# Altium footprint library Power_PcbLib.PcbLib: 23 footprints (part 2 of 2)
Each footprint in its own frame and in the unit in brackets; x right, y up, seen from the top. Pads: shape width x height; smd on the part's side, far side on the other; paste and mask are expansions set on the pad; w line width, h text height; cw(c..) or ccw(c..) is an arc to the next point about the centre after c.
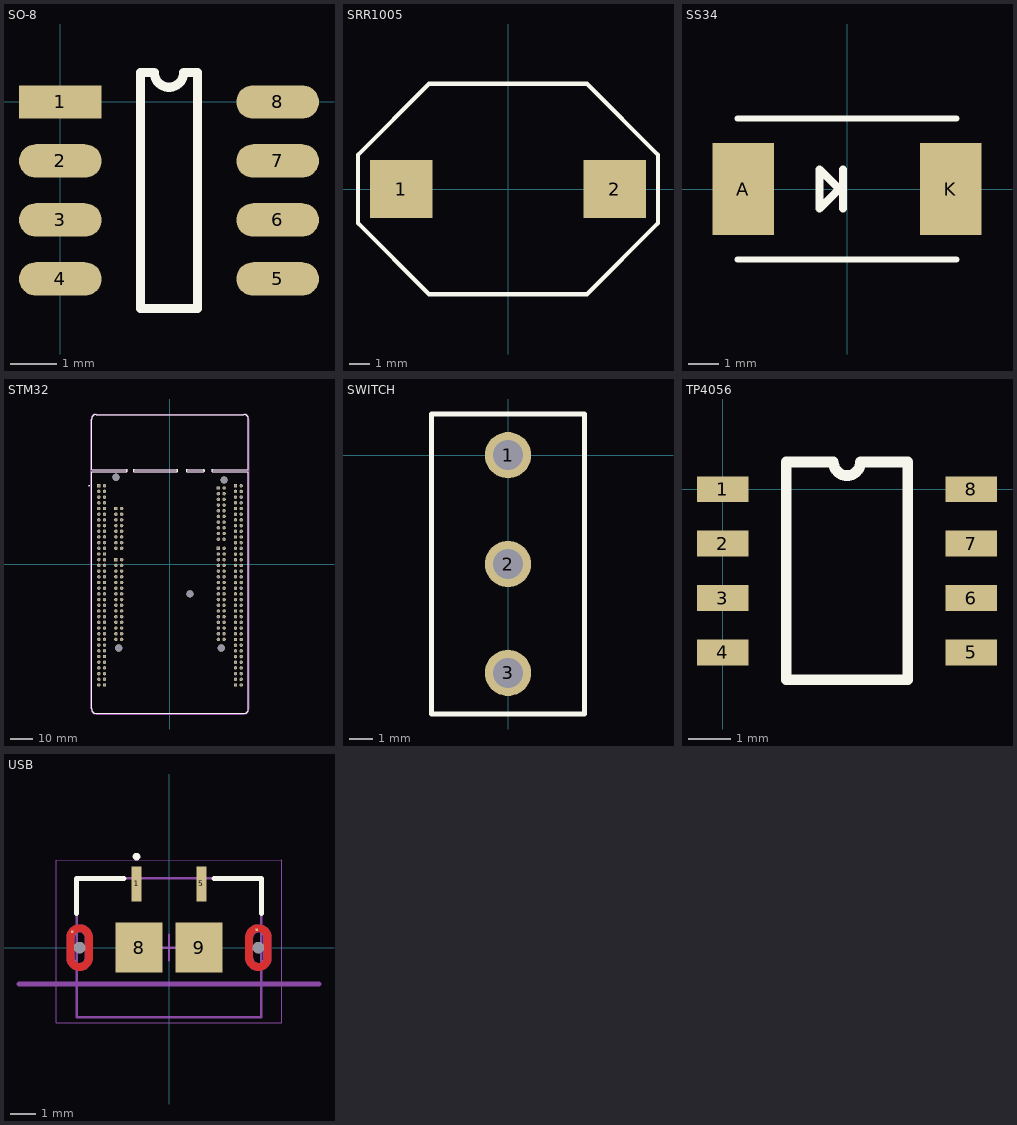
[diagram p1: the footprints below, top view; thin cyan lines are the x and y axes]

## SO-8 [mm]
pads (8):
  rect 1.78x0.72 smd: 1(0,0)
  oval 1.78x0.72 smd: 2(0,-1.27) 3(0,-2.54) 4(0,-3.81) 5(4.68,-3.81) 6(4.68,-2.54) 7(4.68,-1.27) 8(4.68,0)
Top Overlay:
  lines w0.2: 1.725,-4.445 1.725,0.635 2.023,0.635 ccw(c2.34,0.635) 2.658,0.635 2.955,0.635 2.955,-4.445 1.725,-4.445

## SRR1005 [mm]
pads (2):
  rect 3x2.8 smd: 1(-5.15,0) 2(5.15,0)
Top Overlay:
  lines w0.2: -7.239,-1.651 -7.239,1.651 -3.81,5.08 3.81,5.08 7.239,1.651 7.239,-1.651 3.81,-5.08 -3.81,-5.08 -7.239,-1.651

## SS34 [mm]
pads (2):
  rect 2x3 smd: A(-3.375,0) K(3.375,0)
Top Overlay:
  lines w0.2: -3.556,-2.286 3.556,-2.286 ; -3.556,2.286 3.556,2.286
  lines w0.254: -0.127,-0.635 -0.127,0.635 ; -0.889,-0.635 -0.889,0.635 -0.254,0 -0.889,-0.635

## STM32 [mm]
pads (249):
  rect 1.53x1.53 hole 1.02: CN7_1(21.717,33.914) CN8_1(-24.003,24.77) CN9_1(-24.003,1.91) CN10_1(21.717,6.99) CN11_1(-31.623,34.93) CN12_1(29.337,34.91)
  round 1.53 hole 1.02: CN7_2(24.257,33.914) CN7_3(21.717,31.374) CN7_4(24.257,31.374) CN7_5(21.717,28.834) CN7_6(24.257,28.834) CN7_7(21.717,26.294) CN7_8(24.257,26.294) CN7_9(21.717,23.754) CN7_10(24.257,23.754) CN7_11(21.717,21.214) CN7_12(24.257,21.214) CN7_13(21.717,18.674) CN7_14(24.257,18.674) CN7_15(21.717,16.134) CN7_16(24.257,16.134) CN7_17(21.717,13.594) CN7_18(24.257,13.594) CN7_19(21.717,11.054) CN7_20(24.257,11.054) CN8_2(-21.463,24.77) CN8_3(-24.003,22.23) CN8_4(-21.463,22.23) CN8_5(-24.003,19.69) CN8_6(-21.463,19.69) CN8_7(-24.003,17.15) CN8_8(-21.463,17.15) CN8_9(-24.003,14.61) CN8_10(-21.463,14.61) CN8_11(-24.003,12.07) CN8_12(-21.463,12.07) CN8_13(-24.003,9.53) CN8_14(-21.463,9.53) CN8_15(-24.003,6.99) CN8_16(-21.463,6.99) CN9_2(-21.463,1.91) CN9_3(-24.003,-0.63) CN9_4(-21.463,-0.63) CN9_5(-24.003,-3.17) CN9_6(-21.463,-3.17) CN9_7(-24.003,-5.71) CN9_8(-21.463,-5.71) CN9_9(-24.003,-8.25) CN9_10(-21.463,-8.25) CN9_11(-24.003,-10.79) CN9_12(-21.463,-10.79) CN9_13(-24.003,-13.33) CN9_14(-21.463,-13.33) CN9_15(-24.003,-15.87) CN9_16(-21.463,-15.87) CN9_17(-24.003,-18.41) CN9_18(-21.463,-18.41) CN9_19(-24.003,-20.95) CN9_20(-21.463,-20.95) CN9_21(-24.003,-23.49) CN9_22(-21.463,-23.49) CN9_23(-24.003,-26.03) CN9_24(-21.463,-26.03) CN9_25(-24.003,-28.57) CN9_26(-21.463,-28.57) CN9_27(-24.003,-31.11) CN9_28(-21.463,-31.11) CN9_29(-24.003,-33.65) CN9_30(-21.463,-33.65) CN10_2(24.257,6.99) CN10_3(21.717,4.45) CN10_4(24.257,4.45) CN10_5(21.717,1.91) CN10_6(24.257,1.91) CN10_7(21.717,-0.63) CN10_8(24.257,-0.63) CN10_9(21.717,-3.17) CN10_10(24.257,-3.17) CN10_11(21.717,-5.71) CN10_12(24.257,-5.71) CN10_13(21.717,-8.25) CN10_14(24.257,-8.25) CN10_15(21.717,-10.79) CN10_16(24.257,-10.79) CN10_17(21.717,-13.33) CN10_18(24.257,-13.33) CN10_19(21.717,-15.87) CN10_20(24.257,-15.87) CN10_21(21.717,-18.41) CN10_22(24.257,-18.41) CN10_23(21.717,-20.95) CN10_24(24.257,-20.95) CN10_25(21.717,-23.49) CN10_26(24.257,-23.49) CN10_27(21.717,-26.03) CN10_28(24.257,-26.03) CN10_29(21.717,-28.57) CN10_30(24.257,-28.57) CN10_31(21.717,-31.11) CN10_32(24.257,-31.11) CN10_33(21.717,-33.65) CN10_34(24.257,-33.65) CN11_2(-29.083,34.93) CN11_3(-31.623,32.39) CN11_4(-29.083,32.39) CN11_5(-31.623,29.85) CN11_6(-29.083,29.85) CN11_7(-31.623,27.31) CN11_8(-29.083,27.31) CN11_9(-31.623,24.77) CN11_10(-29.083,24.77) CN11_11(-31.623,22.23) CN11_12(-29.083,22.23) CN11_13(-31.623,19.69) CN11_14(-29.083,19.69) CN11_15(-31.623,17.15) CN11_16(-29.083,17.15) CN11_17(-31.623,14.61) CN11_18(-29.083,14.61) CN11_19(-31.623,12.07) CN11_20(-29.083,12.07) CN11_21(-31.623,9.53) CN11_22(-29.083,9.53) CN11_23(-31.623,6.99) CN11_24(-29.083,6.99) CN11_25(-31.623,4.45) CN11_26(-29.083,4.45) CN11_27(-31.623,1.91) CN11_28(-29.083,1.91) CN11_29(-31.623,-0.63) CN11_30(-29.083,-0.63) CN11_31(-31.623,-3.17) CN11_32(-29.083,-3.17) CN11_33(-31.623,-5.71) CN11_34(-29.083,-5.71) CN11_35(-31.623,-8.25) CN11_36(-29.083,-8.25) CN11_37(-31.623,-10.79) CN11_38(-29.083,-10.79) CN11_39(-31.623,-13.33) CN11_40(-29.083,-13.33) CN11_41(-31.623,-15.87) CN11_42(-29.083,-15.87) CN11_43(-31.623,-18.41) CN11_44(-29.083,-18.41) CN11_45(-31.623,-20.95) CN11_46(-29.083,-20.95) CN11_47(-31.623,-23.49) CN11_48(-29.083,-23.49) CN11_49(-31.623,-26.03) CN11_50(-29.083,-26.03) CN11_51(-31.623,-28.57) CN11_52(-29.083,-28.57) CN11_53(-31.623,-31.11) CN11_54(-29.083,-31.11) CN11_55(-31.623,-33.65) CN11_56(-29.083,-33.65) CN11_57(-31.623,-36.19) CN11_58(-29.083,-36.19) CN11_59(-31.623,-38.73) CN11_60(-29.083,-38.73) CN11_61(-31.623,-41.27) CN11_62(-29.083,-41.27) CN11_63(-31.623,-43.81) CN11_64(-29.083,-43.81) CN11_65(-31.623,-46.35) CN11_66(-29.083,-46.35) CN11_67(-31.623,-48.89) CN11_68(-29.083,-48.89) CN11_69(-31.623,-51.43) CN11_70(-29.083,-51.43) CN11_71(-31.623,-53.97) CN11_72(-29.083,-53.97) CN12_2(31.877,34.91) CN12_3(29.337,32.37) CN12_4(31.877,32.37) CN12_5(29.337,29.83) CN12_6(31.877,29.83) CN12_7(29.337,27.29) CN12_8(31.877,27.29) CN12_9(29.337,24.75) CN12_10(31.877,24.75) CN12_11(29.337,22.21) CN12_12(31.877,22.21) CN12_13(29.337,19.67) CN12_14(31.877,19.67) CN12_15(29.337,17.13) CN12_16(31.877,17.13) CN12_17(29.337,14.59) CN12_18(31.877,14.59) CN12_19(29.337,12.05) CN12_20(31.877,12.05) CN12_21(29.337,9.51) CN12_22(31.877,9.51) CN12_23(29.337,6.97) CN12_24(31.877,6.97) CN12_25(29.337,4.43) CN12_26(31.877,4.43) CN12_27(29.337,1.89) CN12_28(31.877,1.89) CN12_29(29.337,-0.65) CN12_30(31.877,-0.65) CN12_31(29.337,-3.19) CN12_32(31.877,-3.19) CN12_33(29.337,-5.73) CN12_34(31.877,-5.73) CN12_35(29.337,-8.27) CN12_36(31.877,-8.27) CN12_37(29.337,-10.81) CN12_38(31.877,-10.81) CN12_39(29.337,-13.35) CN12_40(31.877,-13.35) CN12_41(29.337,-15.89) CN12_42(31.877,-15.89) CN12_43(29.337,-18.43) CN12_44(31.877,-18.43) CN12_45(29.337,-20.97) CN12_46(31.877,-20.97) CN12_47(29.337,-23.51) CN12_48(31.877,-23.51) CN12_49(29.337,-26.05) CN12_50(31.877,-26.05) CN12_51(29.337,-28.59) CN12_52(31.877,-28.59) CN12_53(29.337,-31.13) CN12_54(31.877,-31.13) CN12_55(29.337,-33.67) CN12_56(31.877,-33.67) CN12_57(29.337,-36.21) CN12_58(31.877,-36.21) CN12_59(29.337,-38.75) CN12_60(31.877,-38.75) CN12_61(29.337,-41.29) CN12_62(31.877,-41.29) CN12_63(29.337,-43.83) CN12_64(31.877,-43.83) CN12_65(29.337,-46.37) CN12_66(31.877,-46.37) CN12_67(29.337,-48.91) CN12_68(31.877,-48.91) CN12_69(29.337,-51.45) CN12_70(31.877,-51.45) CN12_71(29.337,-53.99) CN12_72(31.877,-53.99)
  round 3.2 hole 3.2 unplated: ""(-24.003,38.74) ""(-22.733,-37.46) ""(9.017,-13.33) ""(22.987,-37.46) ""(24.257,37.47)
Top Overlay:
  circle w0.2: c-35.913,34.93 r0.1
  lines w0.127: -19.38,41.17 -34.873,41.17 -34.873,-64.67 ccw(c-32.873,-64.67) -32.873,-66.67 33.127,-66.67 ccw(c33.127,-64.67) 35.127,-64.67 35.127,41.17 19.126,41.17 ; -19.38,42.11 -34.873,42.11 -34.873,64.67 cw(c-32.873,64.67) -32.873,66.67 33.127,66.67 cw(c33.127,64.67) 35.127,64.67 35.127,42.11 19.126,42.11 ; -19.379,41.17 ccw(c-19.388,41.64) -19.379,42.11 ; -15.876,41.17 cw(c-15.868,41.64) -15.876,42.11 ; -15.875,41.17 3.124,41.17 ; -15.875,42.11 3.124,42.11 ; 3.125,41.17 ccw(c3.117,41.64) 3.125,42.11 ; 7.746,41.17 cw(c7.754,41.64) 7.746,42.11 ; 7.747,41.17 15.062,41.17 ; 7.747,42.11 15.062,42.11 ; 15.063,41.17 ccw(c15.055,41.64) 15.063,42.11 ; 19.125,41.17 cw(c19.134,41.64) 19.125,42.11
Mechanical 13:
  circle w0.2: c-35.913,34.93 r0.1
  lines w0.127: -19.38,41.17 -34.873,41.17 -34.873,-64.67 ccw(c-32.873,-64.67) -32.873,-66.67 33.127,-66.67 ccw(c33.127,-64.67) 35.127,-64.67 35.127,41.17 19.126,41.17 ; -19.38,42.11 -34.873,42.11 -34.873,64.67 cw(c-32.873,64.67) -32.873,66.67 33.127,66.67 cw(c33.127,64.67) 35.127,64.67 35.127,42.11 19.126,42.11 ; -19.379,41.17 ccw(c-19.388,41.64) -19.379,42.11 ; -15.876,41.17 cw(c-15.868,41.64) -15.876,42.11 ; -15.875,41.17 3.124,41.17 ; -15.875,42.11 3.124,42.11 ; 3.125,41.17 ccw(c3.117,41.64) 3.125,42.11 ; 7.746,41.17 cw(c7.754,41.64) 7.746,42.11 ; 7.747,41.17 15.062,41.17 ; 7.747,42.11 15.062,42.11 ; 15.063,41.17 ccw(c15.055,41.64) 15.063,42.11 ; 19.125,41.17 cw(c19.134,41.64) 19.125,42.11
Mechanical 15:
  lines w0.05: -35.123,-64.67 ccw(c-32.873,-64.67) -32.873,-66.92 33.127,-66.92 ccw(c33.127,-64.67) 35.377,-64.67 35.377,64.67 ccw(c33.127,64.67) 33.127,66.92 -32.873,66.92 ccw(c-32.873,64.67) -35.123,64.67 -35.123,-64.67
3D body "step_temp.STEP": height 12.28, standoff -8.54, extent -34.873,-69.27 35.127,67.72

## SWITCH [mm]
pads (3):
  round 2 hole 1.3: 1(0,0) 2(0,-4.7) 3(0,-9.4)
Top Overlay:
  lines w0.2: -3.302,-11.176 3.302,-11.176 3.302,1.778 -3.302,1.778 -3.302,-11.176

## TP4056 [mm]
pads (8):
  rect 1.2x0.6 smd: 1(0,0) 2(0,-1.27) 3(0,-2.54) 4(0,-3.81) 5(5.8,-3.81) 6(5.8,-2.54) 7(5.8,-1.27) 8(5.8,0)
Top Overlay:
  lines w0.25: 1.485,-4.445 4.315,-4.445 4.315,0.635 3.217,0.635 cw(c2.9,0.635) 2.582,0.635 1.485,0.635 1.485,-4.445

## USB [mm]
pads (8):
  rect 0.4x1.4 smd: 1(-1.3,2.55) 5(1.3,2.55)
  rect 0.1x0.1 smd paste-1 mask+0: 6(-3.87,0.63) 7(3.51,0.72)
  rect 1.9x2 smd: 8(-1.2,0) 9(1.2,0)
  round 0.45 hole 0.45 unplated: ""(-3.575,0) ""(3.575,0)
Top Layer:
  region: 4.1,-0.4 4.099,-0.427 4.097,-0.455 4.094,-0.482 4.089,-0.509 4.082,-0.536 4.074,-0.562 4.065,-0.588 4.055,-0.614 4.043,-0.638 4.03,-0.663 4.015,-0.686 4,-0.709 3.983,-0.73 3.965,-0.751 3.946,-0.771 3.926,-0.79 3.905,-0.808 3.884,-0.825 3.861,-0.84 3.838,-0.855 3.813,-0.868 3.789,-0.88 3.763,-0.89 3.737,-0.899 3.711,-0.907 3.684,-0.914 3.657,-0.919 3.63,-0.922 3.602,-0.924 3.575,-0.925 3.548,-0.924 3.52,-0.922 3.493,-0.919 3.466,-0.914 3.439,-0.907 3.413,-0.899 3.387,-0.89 3.361,-0.88 3.337,-0.868 3.313,-0.855 3.289,-0.84 3.266,-0.825 3.245,-0.808 3.224,-0.79 3.204,-0.771 3.185,-0.751 3.167,-0.73 3.15,-0.709 3.135,-0.686 3.12,-0.663 3.107,-0.638 3.095,-0.614 3.085,-0.588 3.076,-0.562 3.068,-0.536 3.061,-0.509 3.056,-0.482 3.053,-0.455 3.051,-0.427 3.05,-0.4 3.05,0 3.35,0 3.35,-0.4 3.35,-0.412 3.351,-0.424 3.353,-0.435 3.355,-0.447 3.358,-0.458 3.361,-0.47 3.365,-0.481 3.369,-0.492 3.375,-0.502 3.38,-0.513 3.386,-0.523 3.393,-0.532 3.4,-0.542 3.408,-0.551 3.416,-0.559 3.424,-0.567 3.433,-0.575 3.443,-0.582 3.452,-0.589 3.463,-0.595 3.473,-0.6 3.483,-0.606 3.494,-0.61 3.505,-0.614 3.517,-0.617 3.528,-0.62 3.54,-0.622 3.551,-0.624 3.563,-0.625 3.575,-0.625 3.587,-0.625 3.599,-0.624 3.61,-0.622 3.622,-0.62 3.633,-0.617 3.645,-0.614 3.656,-0.61 3.667,-0.606 3.677,-0.6 3.688,-0.595 3.698,-0.589 3.707,-0.582 3.717,-0.575 3.726,-0.567 3.734,-0.559 3.742,-0.551 3.75,-0.542 3.757,-0.532 3.764,-0.523 3.77,-0.513 3.775,-0.502 3.781,-0.492 3.785,-0.481 3.789,-0.47 3.792,-0.458 3.795,-0.447 3.797,-0.435 3.799,-0.424 3.8,-0.412 3.8,-0.4 3.8,0 4.1,0
  region: 3.602,0.924 3.63,0.922 3.657,0.919 3.684,0.914 3.711,0.907 3.737,0.899 3.763,0.89 3.789,0.88 3.813,0.868 3.838,0.855 3.861,0.84 3.884,0.825 3.905,0.808 3.926,0.79 3.946,0.771 3.965,0.751 3.983,0.73 4,0.709 4.015,0.686 4.03,0.663 4.043,0.638 4.055,0.614 4.065,0.588 4.074,0.562 4.082,0.536 4.089,0.509 4.094,0.482 4.097,0.455 4.099,0.427 4.1,0.4 4.1,0 3.8,0 3.8,0.4 3.8,0.412 3.799,0.424 3.797,0.435 3.795,0.447 3.792,0.458 3.789,0.47 3.785,0.481 3.781,0.492 3.775,0.502 3.77,0.513 3.764,0.523 3.757,0.532 3.75,0.542 3.742,0.551 3.734,0.559 3.726,0.567 3.717,0.575 3.707,0.582 3.698,0.589 3.688,0.595 3.677,0.6 3.667,0.606 3.656,0.61 3.645,0.614 3.633,0.617 3.622,0.62 3.61,0.622 3.599,0.624 3.587,0.625 3.575,0.625 3.563,0.625 3.551,0.624 3.54,0.622 3.528,0.62 3.517,0.617 3.505,0.614 3.494,0.61 3.483,0.606 3.473,0.6 3.463,0.595 3.452,0.589 3.443,0.582 3.433,0.575 3.424,0.567 3.416,0.559 3.408,0.551 3.4,0.542 3.393,0.532 3.386,0.523 3.38,0.513 3.375,0.502 3.369,0.492 3.365,0.481 3.361,0.47 3.358,0.458 3.355,0.447 3.353,0.435 3.351,0.424 3.35,0.412 3.35,0.4 3.35,0 3.05,0 3.05,0.4 3.051,0.427 3.053,0.455 3.056,0.482 3.061,0.509 3.068,0.536 3.076,0.562 3.085,0.588 3.095,0.614 3.107,0.638 3.12,0.663 3.135,0.686 3.15,0.709 3.167,0.73 3.185,0.751 3.204,0.771 3.224,0.79 3.245,0.808 3.266,0.825 3.289,0.84 3.313,0.855 3.337,0.868 3.361,0.88 3.387,0.89 3.413,0.899 3.439,0.907 3.466,0.914 3.493,0.919 3.52,0.922 3.548,0.924 3.575,0.925
  region: -3.05,-0.4 -3.051,-0.427 -3.053,-0.455 -3.056,-0.482 -3.061,-0.509 -3.068,-0.536 -3.076,-0.562 -3.085,-0.588 -3.095,-0.614 -3.107,-0.638 -3.12,-0.663 -3.135,-0.686 -3.15,-0.709 -3.167,-0.73 -3.185,-0.751 -3.204,-0.771 -3.224,-0.79 -3.245,-0.808 -3.266,-0.825 -3.289,-0.84 -3.313,-0.855 -3.337,-0.868 -3.361,-0.88 -3.387,-0.89 -3.413,-0.899 -3.439,-0.907 -3.466,-0.914 -3.493,-0.919 -3.52,-0.922 -3.548,-0.924 -3.575,-0.925 -3.602,-0.924 -3.63,-0.922 -3.657,-0.919 -3.684,-0.914 -3.711,-0.907 -3.737,-0.899 -3.763,-0.89 -3.789,-0.88 -3.813,-0.868 -3.838,-0.855 -3.861,-0.84 -3.884,-0.825 -3.905,-0.808 -3.926,-0.79 -3.946,-0.771 -3.965,-0.751 -3.983,-0.73 -4,-0.709 -4.015,-0.686 -4.03,-0.663 -4.043,-0.638 -4.055,-0.614 -4.065,-0.588 -4.074,-0.562 -4.082,-0.536 -4.089,-0.509 -4.094,-0.482 -4.097,-0.455 -4.099,-0.427 -4.1,-0.4 -4.1,0 -3.8,0 -3.8,-0.4 -3.8,-0.412 -3.799,-0.424 -3.797,-0.435 -3.795,-0.447 -3.792,-0.458 -3.789,-0.47 -3.785,-0.481 -3.781,-0.492 -3.775,-0.502 -3.77,-0.513 -3.764,-0.523 -3.757,-0.532 -3.75,-0.542 -3.742,-0.551 -3.734,-0.559 -3.726,-0.567 -3.717,-0.575 -3.707,-0.582 -3.698,-0.589 -3.688,-0.595 -3.677,-0.6 -3.667,-0.606 -3.656,-0.61 -3.645,-0.614 -3.633,-0.617 -3.622,-0.62 -3.61,-0.622 -3.599,-0.624 -3.587,-0.625 -3.575,-0.625 -3.563,-0.625 -3.551,-0.624 -3.54,-0.622 -3.528,-0.62 -3.517,-0.617 -3.505,-0.614 -3.494,-0.61 -3.483,-0.606 -3.473,-0.6 -3.463,-0.595 -3.452,-0.589 -3.443,-0.582 -3.433,-0.575 -3.424,-0.567 -3.416,-0.559 -3.408,-0.551 -3.4,-0.542 -3.393,-0.532 -3.386,-0.523 -3.38,-0.513 -3.375,-0.502 -3.369,-0.492 -3.365,-0.481 -3.361,-0.47 -3.358,-0.458 -3.355,-0.447 -3.353,-0.435 -3.351,-0.424 -3.35,-0.412 -3.35,-0.4 -3.35,0 -3.05,0
  region: -3.548,0.924 -3.52,0.922 -3.493,0.919 -3.466,0.914 -3.439,0.907 -3.413,0.899 -3.387,0.89 -3.361,0.88 -3.337,0.868 -3.313,0.855 -3.289,0.84 -3.266,0.825 -3.245,0.808 -3.224,0.79 -3.204,0.771 -3.185,0.751 -3.167,0.73 -3.15,0.709 -3.135,0.686 -3.12,0.663 -3.107,0.638 -3.095,0.614 -3.085,0.588 -3.076,0.562 -3.068,0.536 -3.061,0.509 -3.056,0.482 -3.053,0.455 -3.051,0.427 -3.05,0.4 -3.05,0 -3.35,0 -3.35,0.4 -3.35,0.412 -3.351,0.424 -3.353,0.435 -3.355,0.447 -3.358,0.458 -3.361,0.47 -3.365,0.481 -3.369,0.492 -3.375,0.502 -3.38,0.513 -3.386,0.523 -3.393,0.532 -3.4,0.542 -3.408,0.551 -3.416,0.559 -3.424,0.567 -3.433,0.575 -3.443,0.582 -3.452,0.589 -3.463,0.595 -3.473,0.6 -3.483,0.606 -3.494,0.61 -3.505,0.614 -3.517,0.617 -3.528,0.62 -3.54,0.622 -3.551,0.624 -3.563,0.625 -3.575,0.625 -3.587,0.625 -3.599,0.624 -3.61,0.622 -3.622,0.62 -3.633,0.617 -3.645,0.614 -3.656,0.61 -3.667,0.606 -3.677,0.6 -3.688,0.595 -3.698,0.589 -3.707,0.582 -3.717,0.575 -3.726,0.567 -3.734,0.559 -3.742,0.551 -3.75,0.542 -3.757,0.532 -3.764,0.523 -3.77,0.513 -3.775,0.502 -3.781,0.492 -3.785,0.481 -3.789,0.47 -3.792,0.458 -3.795,0.447 -3.797,0.435 -3.799,0.424 -3.8,0.412 -3.8,0.4 -3.8,0 -4.1,0 -4.1,0.4 -4.099,0.427 -4.097,0.455 -4.094,0.482 -4.089,0.509 -4.082,0.536 -4.074,0.562 -4.065,0.588 -4.055,0.614 -4.043,0.638 -4.03,0.663 -4.015,0.686 -4,0.709 -3.983,0.73 -3.965,0.751 -3.946,0.771 -3.926,0.79 -3.905,0.808 -3.884,0.825 -3.861,0.84 -3.838,0.855 -3.813,0.868 -3.789,0.88 -3.763,0.89 -3.737,0.899 -3.711,0.907 -3.684,0.914 -3.657,0.919 -3.63,0.922 -3.602,0.924 -3.575,0.925
Bottom Layer:
  region: 4.1,-0.4 4.099,-0.427 4.097,-0.455 4.094,-0.482 4.089,-0.509 4.082,-0.536 4.074,-0.562 4.065,-0.588 4.055,-0.614 4.043,-0.638 4.03,-0.663 4.015,-0.686 4,-0.709 3.983,-0.73 3.965,-0.751 3.946,-0.771 3.926,-0.79 3.905,-0.808 3.884,-0.825 3.861,-0.84 3.838,-0.855 3.813,-0.868 3.789,-0.88 3.763,-0.89 3.737,-0.899 3.711,-0.907 3.684,-0.914 3.657,-0.919 3.63,-0.922 3.602,-0.924 3.575,-0.925 3.548,-0.924 3.52,-0.922 3.493,-0.919 3.466,-0.914 3.439,-0.907 3.413,-0.899 3.387,-0.89 3.361,-0.88 3.337,-0.868 3.313,-0.855 3.289,-0.84 3.266,-0.825 3.245,-0.808 3.224,-0.79 3.204,-0.771 3.185,-0.751 3.167,-0.73 3.15,-0.709 3.135,-0.686 3.12,-0.663 3.107,-0.638 3.095,-0.614 3.085,-0.588 3.076,-0.562 3.068,-0.536 3.061,-0.509 3.056,-0.482 3.053,-0.455 3.051,-0.427 3.05,-0.4 3.05,0 3.35,0 3.35,-0.4 3.35,-0.412 3.351,-0.424 3.353,-0.435 3.355,-0.447 3.358,-0.458 3.361,-0.47 3.365,-0.481 3.369,-0.492 3.375,-0.502 3.38,-0.513 3.386,-0.523 3.393,-0.532 3.4,-0.542 3.408,-0.551 3.416,-0.559 3.424,-0.567 3.433,-0.575 3.443,-0.582 3.452,-0.589 3.463,-0.595 3.473,-0.6 3.483,-0.606 3.494,-0.61 3.505,-0.614 3.517,-0.617 3.528,-0.62 3.54,-0.622 3.551,-0.624 3.563,-0.625 3.575,-0.625 3.587,-0.625 3.599,-0.624 3.61,-0.622 3.622,-0.62 3.633,-0.617 3.645,-0.614 3.656,-0.61 3.667,-0.606 3.677,-0.6 3.688,-0.595 3.698,-0.589 3.707,-0.582 3.717,-0.575 3.726,-0.567 3.734,-0.559 3.742,-0.551 3.75,-0.542 3.757,-0.532 3.764,-0.523 3.77,-0.513 3.775,-0.502 3.781,-0.492 3.785,-0.481 3.789,-0.47 3.792,-0.458 3.795,-0.447 3.797,-0.435 3.799,-0.424 3.8,-0.412 3.8,-0.4 3.8,0 4.1,0
  region: 3.602,0.924 3.63,0.922 3.657,0.919 3.684,0.914 3.711,0.907 3.737,0.899 3.763,0.89 3.789,0.88 3.813,0.868 3.838,0.855 3.861,0.84 3.884,0.825 3.905,0.808 3.926,0.79 3.946,0.771 3.965,0.751 3.983,0.73 4,0.709 4.015,0.686 4.03,0.663 4.043,0.638 4.055,0.614 4.065,0.588 4.074,0.562 4.082,0.536 4.089,0.509 4.094,0.482 4.097,0.455 4.099,0.427 4.1,0.4 4.1,0 3.8,0 3.8,0.4 3.8,0.412 3.799,0.424 3.797,0.435 3.795,0.447 3.792,0.458 3.789,0.47 3.785,0.481 3.781,0.492 3.775,0.502 3.77,0.513 3.764,0.523 3.757,0.532 3.75,0.542 3.742,0.551 3.734,0.559 3.726,0.567 3.717,0.575 3.707,0.582 3.698,0.589 3.688,0.595 3.677,0.6 3.667,0.606 3.656,0.61 3.645,0.614 3.633,0.617 3.622,0.62 3.61,0.622 3.599,0.624 3.587,0.625 3.575,0.625 3.563,0.625 3.551,0.624 3.54,0.622 3.528,0.62 3.517,0.617 3.505,0.614 3.494,0.61 3.483,0.606 3.473,0.6 3.463,0.595 3.452,0.589 3.443,0.582 3.433,0.575 3.424,0.567 3.416,0.559 3.408,0.551 3.4,0.542 3.393,0.532 3.386,0.523 3.38,0.513 3.375,0.502 3.369,0.492 3.365,0.481 3.361,0.47 3.358,0.458 3.355,0.447 3.353,0.435 3.351,0.424 3.35,0.412 3.35,0.4 3.35,0 3.05,0 3.05,0.4 3.051,0.427 3.053,0.455 3.056,0.482 3.061,0.509 3.068,0.536 3.076,0.562 3.085,0.588 3.095,0.614 3.107,0.638 3.12,0.663 3.135,0.686 3.15,0.709 3.167,0.73 3.185,0.751 3.204,0.771 3.224,0.79 3.245,0.808 3.266,0.825 3.289,0.84 3.313,0.855 3.337,0.868 3.361,0.88 3.387,0.89 3.413,0.899 3.439,0.907 3.466,0.914 3.493,0.919 3.52,0.922 3.548,0.924 3.575,0.925
  region: -3.05,-0.4 -3.051,-0.427 -3.053,-0.455 -3.056,-0.482 -3.061,-0.509 -3.068,-0.536 -3.076,-0.562 -3.085,-0.588 -3.095,-0.614 -3.107,-0.638 -3.12,-0.663 -3.135,-0.686 -3.15,-0.709 -3.167,-0.73 -3.185,-0.751 -3.204,-0.771 -3.224,-0.79 -3.245,-0.808 -3.266,-0.825 -3.289,-0.84 -3.313,-0.855 -3.337,-0.868 -3.361,-0.88 -3.387,-0.89 -3.413,-0.899 -3.439,-0.907 -3.466,-0.914 -3.493,-0.919 -3.52,-0.922 -3.548,-0.924 -3.575,-0.925 -3.602,-0.924 -3.63,-0.922 -3.657,-0.919 -3.684,-0.914 -3.711,-0.907 -3.737,-0.899 -3.763,-0.89 -3.789,-0.88 -3.813,-0.868 -3.838,-0.855 -3.861,-0.84 -3.884,-0.825 -3.905,-0.808 -3.926,-0.79 -3.946,-0.771 -3.965,-0.751 -3.983,-0.73 -4,-0.709 -4.015,-0.686 -4.03,-0.663 -4.043,-0.638 -4.055,-0.614 -4.065,-0.588 -4.074,-0.562 -4.082,-0.536 -4.089,-0.509 -4.094,-0.482 -4.097,-0.455 -4.099,-0.427 -4.1,-0.4 -4.1,0 -3.8,0 -3.8,-0.4 -3.8,-0.412 -3.799,-0.424 -3.797,-0.435 -3.795,-0.447 -3.792,-0.458 -3.789,-0.47 -3.785,-0.481 -3.781,-0.492 -3.775,-0.502 -3.77,-0.513 -3.764,-0.523 -3.757,-0.532 -3.75,-0.542 -3.742,-0.551 -3.734,-0.559 -3.726,-0.567 -3.717,-0.575 -3.707,-0.582 -3.698,-0.589 -3.688,-0.595 -3.677,-0.6 -3.667,-0.606 -3.656,-0.61 -3.645,-0.614 -3.633,-0.617 -3.622,-0.62 -3.61,-0.622 -3.599,-0.624 -3.587,-0.625 -3.575,-0.625 -3.563,-0.625 -3.551,-0.624 -3.54,-0.622 -3.528,-0.62 -3.517,-0.617 -3.505,-0.614 -3.494,-0.61 -3.483,-0.606 -3.473,-0.6 -3.463,-0.595 -3.452,-0.589 -3.443,-0.582 -3.433,-0.575 -3.424,-0.567 -3.416,-0.559 -3.408,-0.551 -3.4,-0.542 -3.393,-0.532 -3.386,-0.523 -3.38,-0.513 -3.375,-0.502 -3.369,-0.492 -3.365,-0.481 -3.361,-0.47 -3.358,-0.458 -3.355,-0.447 -3.353,-0.435 -3.351,-0.424 -3.35,-0.412 -3.35,-0.4 -3.35,0 -3.05,0
  region: -3.548,0.924 -3.52,0.922 -3.493,0.919 -3.466,0.914 -3.439,0.907 -3.413,0.899 -3.387,0.89 -3.361,0.88 -3.337,0.868 -3.313,0.855 -3.289,0.84 -3.266,0.825 -3.245,0.808 -3.224,0.79 -3.204,0.771 -3.185,0.751 -3.167,0.73 -3.15,0.709 -3.135,0.686 -3.12,0.663 -3.107,0.638 -3.095,0.614 -3.085,0.588 -3.076,0.562 -3.068,0.536 -3.061,0.509 -3.056,0.482 -3.053,0.455 -3.051,0.427 -3.05,0.4 -3.05,0 -3.35,0 -3.35,0.4 -3.35,0.412 -3.351,0.424 -3.353,0.435 -3.355,0.447 -3.358,0.458 -3.361,0.47 -3.365,0.481 -3.369,0.492 -3.375,0.502 -3.38,0.513 -3.386,0.523 -3.393,0.532 -3.4,0.542 -3.408,0.551 -3.416,0.559 -3.424,0.567 -3.433,0.575 -3.443,0.582 -3.452,0.589 -3.463,0.595 -3.473,0.6 -3.483,0.606 -3.494,0.61 -3.505,0.614 -3.517,0.617 -3.528,0.62 -3.54,0.622 -3.551,0.624 -3.563,0.625 -3.575,0.625 -3.587,0.625 -3.599,0.624 -3.61,0.622 -3.622,0.62 -3.633,0.617 -3.645,0.614 -3.656,0.61 -3.667,0.606 -3.677,0.6 -3.688,0.595 -3.698,0.589 -3.707,0.582 -3.717,0.575 -3.726,0.567 -3.734,0.559 -3.742,0.551 -3.75,0.542 -3.757,0.532 -3.764,0.523 -3.77,0.513 -3.775,0.502 -3.781,0.492 -3.785,0.481 -3.789,0.47 -3.792,0.458 -3.795,0.447 -3.797,0.435 -3.799,0.424 -3.8,0.412 -3.8,0.4 -3.8,0 -4.1,0 -4.1,0.4 -4.099,0.427 -4.097,0.455 -4.094,0.482 -4.089,0.509 -4.082,0.536 -4.074,0.562 -4.065,0.588 -4.055,0.614 -4.043,0.638 -4.03,0.663 -4.015,0.686 -4,0.709 -3.983,0.73 -3.965,0.751 -3.946,0.771 -3.926,0.79 -3.905,0.808 -3.884,0.825 -3.861,0.84 -3.838,0.855 -3.813,0.868 -3.789,0.88 -3.763,0.89 -3.737,0.899 -3.711,0.907 -3.684,0.914 -3.657,0.919 -3.63,0.922 -3.602,0.924 -3.575,0.925
Top Overlay:
  circle w0.2: c-1.3,3.64 r0.051
  lines w0.2: -3.7,1.37 -3.7,2.775 -1.8,2.775 ; 1.8,2.775 3.7,2.775 3.7,1.37
Top Paste:
  drawing of 4 lines, arcs and shapes, not listed
Bottom Paste:
  drawing of 4 lines, arcs and shapes, not listed
Top Solder:
  region: 4.3,-1.152 2.855,-1.152 2.855,1.15 4.3,1.15
  region: -2.85,-1.152 -4.306,-1.152 -4.306,1.15 -2.85,1.15
Bottom Solder:
  region: 4.3,-1.152 2.855,-1.152 2.855,1.15 4.3,1.15
  region: -2.85,-1.152 -4.307,-1.152 -4.307,1.15 -2.85,1.15
Mechanical 1:
  lines w0: -3.8,-0.4 ccw(c-3.575,-0.4) -3.575,-0.625 ccw(c-3.575,-0.4) -3.35,-0.4 -3.35,0.4 ccw(c-3.575,0.4) -3.575,0.625 ccw(c-3.575,0.4) -3.8,0.4 -3.8,-0.4 ; 3.35,-0.4 ccw(c3.575,-0.4) 3.575,-0.625 ccw(c3.575,-0.4) 3.8,-0.4 3.8,0.4 ccw(c3.575,0.4) 3.575,0.625 ccw(c3.575,0.4) 3.35,0.4 3.35,-0.4
Mechanical 13:
  lines w0.1: -3.7,-2.775 -3.7,2.775 3.7,2.775 3.7,-2.775 -3.7,-2.775
  lines w0.2: -6,-1.45 6,-1.45
  text "PCB Edge" at -1.905,-2.54 h0.67
Mechanical 15:
  lines w0.05: -4.5,-3 -4.5,3.5 4.5,3.51 4.5,-3 -4.5,-3
  lines w0.1: -0.508,0 0.508,0 ; 0,-0.508 0,0.508